# Altium footprint library eLIB.PcbLib: 206 footprints (part 5 of 13)
Each footprint in its own frame and in the unit in brackets; x right, y up, seen from the top. Pads: shape width x height; smd on the part's side, far side on the other; paste and mask are expansions set on the pad; w line width, h text height; cw(c..) or ccw(c..) is an arc to the next point about the centre after c.
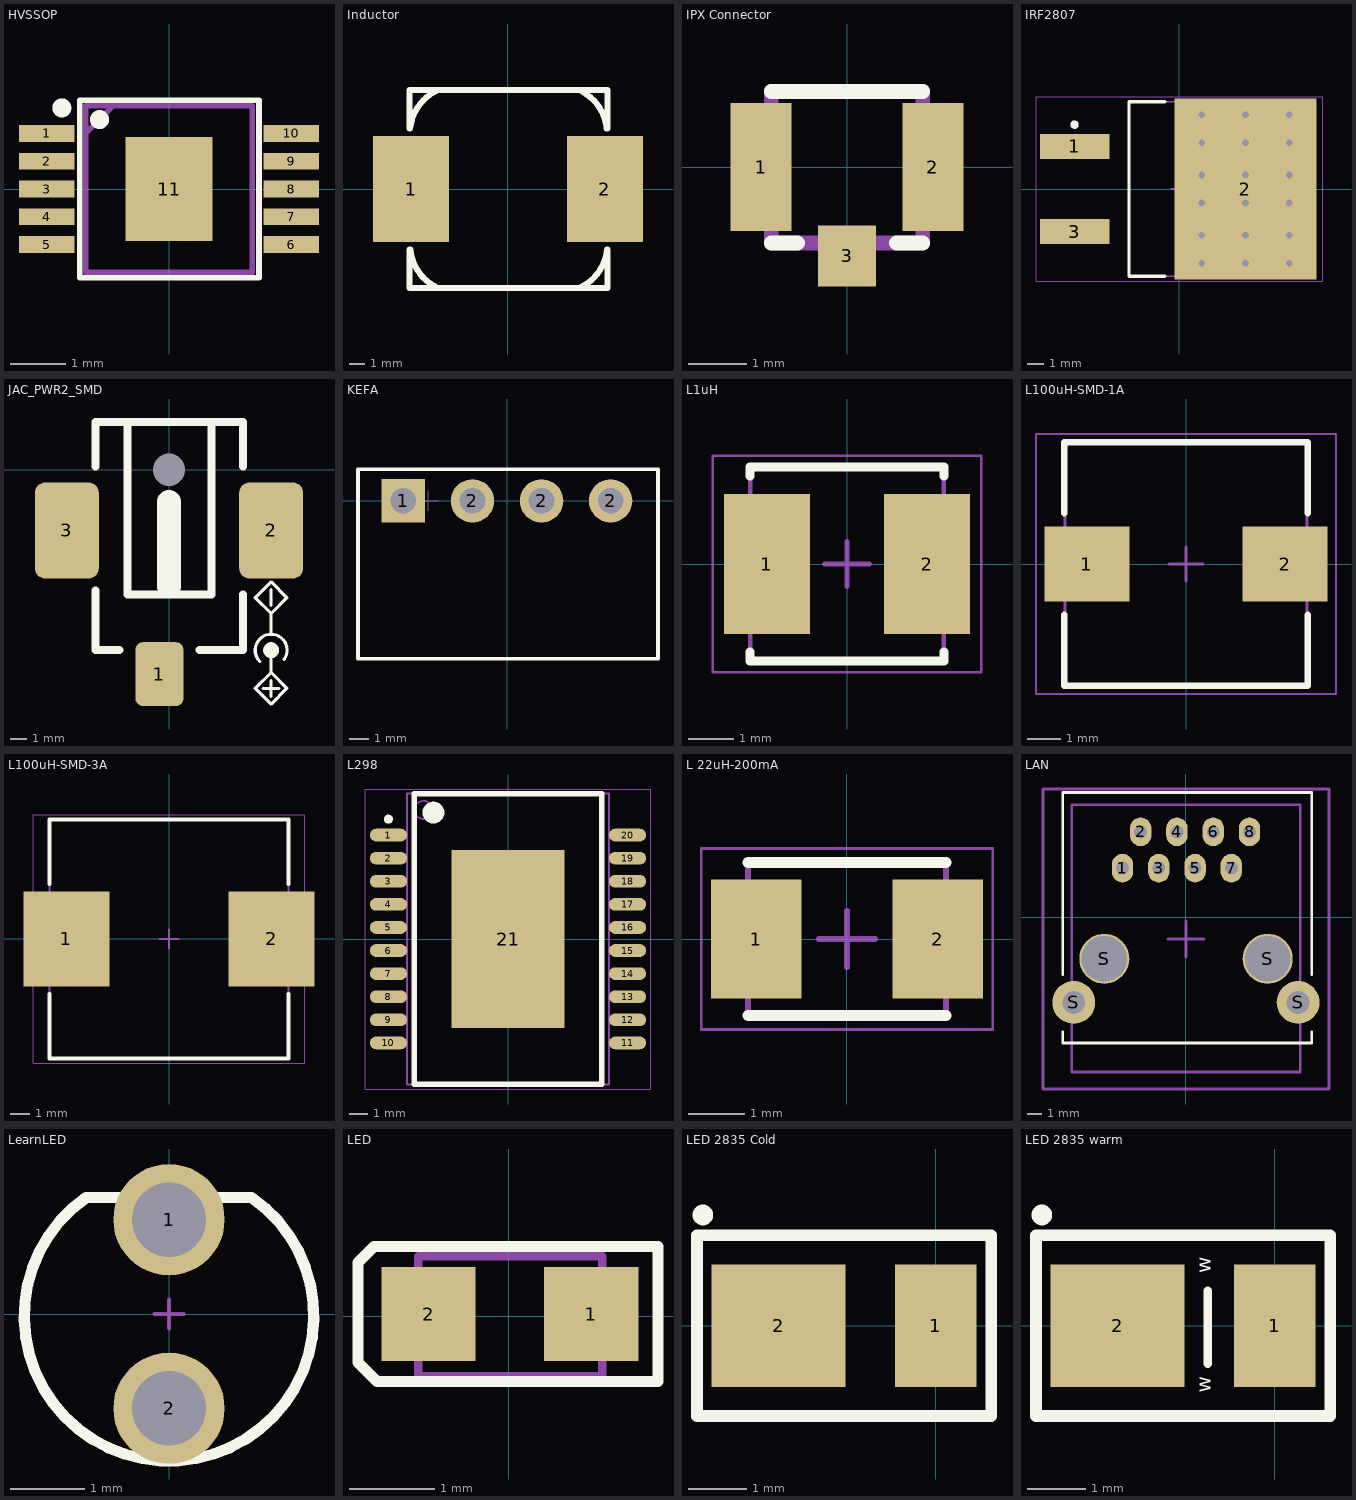
[diagram p4: the footprints below, top view; thin cyan lines are the x and y axes]

## HVSSOP [mm]
pads (11):
  rect 1x0.3 smd: 1(-2.2,1) 2(-2.2,0.5) 3(-2.2,0) 4(-2.2,-0.5) 5(-2.2,-1) 6(2.2,-1) 7(2.2,-0.5) 8(2.2,0) 9(2.2,0.5) 10(2.2,1)
  rect 1.57x1.88 smd: 11(0,0)
Top Overlay:
  circle w0.2: c-1.25,1.25 r0.071
  circle w0.2: c-1.93,1.46 r0.071
  lines w0.1: -1.61,-1.6 -1.61,1.6 1.62,1.6 1.62,-1.6 -1.61,-1.6
Mechanical 13:
  lines w0.1: -1.5,1 -1,1.5 ; -1.5,-1.5 -1.5,1.5 1.5,1.5 1.5,-1.5 -1.5,-1.5
3D body "XTR111AIDGQR.stp": height 1.1, standoff 0, extent -2.45,-1.5 2.45,1.5

## Inductor [mm]
pads (2):
  rect 5x7 smd: 1(-6.4,0) 2(6.4,0)
Top Overlay:
  lines w0.4: -6.504,-3.999 -6.504,-6.539 6.577,-6.539 6.577,-3.999 ; -6.504,4.002 -6.504,6.542 6.577,6.542 6.577,4.002 ; -6.457,3.996 cw(c-3.37,3.69) -4.681,6.501 ; -6.446,-3.993 ccw(c-3.354,-3.689) -4.601,-6.534 ; 4.668,6.54 cw(c3.427,3.692) 6.519,3.996 ; 4.775,-6.491 ccw(c3.446,-3.689) 6.533,-3.995
3D body "SRP1038A-470M.stp": height 4, standoff 0, extent -5.4,-5.07 5.6,4.93

## IPX Connector [mm] "IPX Connector GSP/GPS antenna"
pads (3):
  rect 1.05x2.2 smd: 1(-1.475,0) 2(1.475,0)
  rect 1x1.05 smd: 3(0,-1.525)
Top Overlay:
  lines w0.254: -1.3,-1.3 -0.85,-1.3 ; -1.3,1.3 1.3,1.3 ; 0.85,-1.3 1.3,-1.3
Mechanical 13:
  lines w0.254: -1.3,-1.3 -1.3,1.3 1.3,1.3 1.3,-1.3 -1.3,-1.3
3D body "User Library-IPX ANTENNA.STEP": height 1.27, standoff -0.01, extent -1.5,-1.55 1.5,1.3

## IRF2807 [mm] "D2-PAK, 3-Pads, Body 7.93x8.57mm (max), IPC Medium Density"
height 4.83
pads (3):
  rect 4.15x1.5 smd: 1(-6.25,2.54) 3(-6.25,-2.54)
  rect 8.5x10.8 smd: 2(3.95,0)
via 1.336,-4.424 diameter 0.8 hole 0.4
via 1.336,-2.754 diameter 0.8 hole 0.4
via 1.336,0.835 diameter 0.8 hole 0.4
via 1.336,-0.835 diameter 0.8 hole 0.4
via 1.336,4.423 diameter 0.8 hole 0.4
via 1.336,2.753 diameter 0.8 hole 0.4
via 6.555,-4.424 diameter 0.8 hole 0.4
via 3.945,-2.754 diameter 0.8 hole 0.4
via 3.945,-0.835 diameter 0.8 hole 0.4
via 3.945,0.835 diameter 0.8 hole 0.4
via 6.555,4.423 diameter 0.8 hole 0.4
via 3.945,2.753 diameter 0.8 hole 0.4
via 3.945,-4.424 diameter 0.8 hole 0.4
via 6.555,-2.754 diameter 0.8 hole 0.4
via 6.555,-0.835 diameter 0.8 hole 0.4
via 6.555,0.835 diameter 0.8 hole 0.4
via 6.555,2.753 diameter 0.8 hole 0.4
via 3.945,4.423 diameter 0.8 hole 0.4
Bottom Layer:
  region: 5.838,5.258 5.168,3.588 7.27,3.588 7.941,5.258
  region: 7.271,3.588 7.941,1.918 5.84,1.918 5.168,3.588
  region: 4.66,0 5.33,-1.67 3.229,-1.67 2.557,0
  region: 3.229,1.67 2.559,0 4.66,0 5.331,1.67
  region: 2.049,0 2.719,-1.67 0.618,-1.67 -0.053,0
  region: 0.619,1.67 -0.051,0 2.05,0 2.722,1.67
  region: 5.838,1.67 5.168,0 7.27,0 7.941,1.67
  region: 7.271,0 7.941,-1.67 5.84,-1.67 5.168,0
  region: 7.271,-3.589 7.941,-5.259 5.84,-5.259 5.168,-3.589
  region: 5.838,-1.919 5.168,-3.589 7.27,-3.589 7.941,-1.919
  region: 0.619,-1.919 -0.051,-3.589 2.05,-3.589 2.722,-1.919
  region: 2.049,-3.589 2.719,-5.259 0.618,-5.259 -0.053,-3.589
  region: 3.229,-1.919 2.559,-3.589 4.66,-3.589 5.331,-1.919
  region: 4.66,-3.589 5.33,-5.259 3.229,-5.259 2.557,-3.589
  region: 4.66,3.588 5.33,1.918 3.229,1.918 2.557,3.588
  region: 3.229,5.258 2.559,3.588 4.66,3.588 5.331,5.258
  region: 2.049,3.588 2.719,1.918 0.618,1.918 -0.053,3.588
  region: 0.619,5.258 -0.051,3.588 2.05,3.588 2.722,5.258
Top Overlay:
  circle w0.25: c-6.25,3.84 r0.125
  lines w0.2: -0.85,-5.2 -3,-5.2 -3,5.2 -0.85,5.2
Mechanical 13:
  lines w0.1: -3,-5.2 6.65,-5.2 6.65,5.2 -3,5.2 -3,-5.2
Mechanical 15:
  lines w0.05: -8.55,-5.5 8.55,-5.5 8.55,5.5 -8.55,5.5 -8.55,-5.5
  lines w0.1: -0.5,0 0.5,0 ; 0,-0.5 0,0.5
3D body: height 4.83, standoff 0, extent -3,-5.2 6.65,5.2

## JAC_PWR2_SMD [mm] "DC POWER JACK, CUI PJ-036A-SMT"
pads (4):
  rrect30% 3x4 smd: 1(-0.6,-12.8)
  rrect30% 4x6 smd: 2(6.4,-3.8) 3(-6.4,-3.8)
  rrect30% 0x0 hole 2.032 unplated: 4(0,0)
Top Overlay:
  circle w0.4: c6.4,-11.3 r0.3
  lines w0.2: 5.693,-12.007 cw(c6.4,-11.3) 7.219,-11.874 ; 5.9,-13.7 6.9,-13.7 ; 6.4,-14.2 6.4,-13.2 ; 6.4,-11.3 6.4,-12.7 ; 6.4,-10.3 6.4,-9 ; 6.4,-8.5 6.4,-7.5 ; 6.4,-12.7 5.41,-13.69 6.4,-14.68 7.39,-13.69 6.4,-12.7 ; 6.4,-9 7.39,-8.01 6.4,-7.02 5.41,-8.01 6.4,-9
  lines w0.5: -4.6,-7.55 -4.6,-11.3 -3.1,-11.3 ; -4.6,0.2 -4.6,3 4.65,3 4.65,0.2 ; -2.6,3 -2.6,-7.8 2.65,-7.8 2.65,2.9 ; 1.9,-11.3 4.65,-11.3 4.65,-7.8
  lines w1.5: 0,-7.3 0,-2
3D body "CUI-PJ-036A-SMT.step": height 11.09, standoff -1.51, extent -7.5,-14.1 7.7,3

## KEFA [mm] "KEFA 2.54"
pads (4):
  rect 2.2x2.2 hole 1.3: 1(-5.25,0)
  round 2.2 hole 1.3: 2(-1.75,0) 2(1.75,0) 2(5.25,0)
Top Overlay:
  lines w0.2: -7.55,-8 7.65,-8 7.65,1.6 -7.55,1.6 -7.55,-8
Mechanical 15:
  lines w0.05: -4.48,0 -3.48,0 ; -3.98,-0.5 -3.98,0.5
3D body "KEFA.STEP": height 7.2, standoff -3.7, extent -7.45,-7.85 7.55,1.45

## L1uH [mm] "Coilcraft XFL4020-102 4 x 4 x 2.1 5.1A/10.8 mO"
height 2.29
pads (2):
  rect 1.9x3.1 smd: 1(-1.775,0) 2(1.775,0)
Top Overlay:
  lines w0.2: -2.15,-1.95 -2.15,-2.15 2.15,-2.15 2.15,-1.95 ; -2.15,1.95 -2.15,2.15 2.15,2.15 2.15,1.95
Mechanical 13:
  lines w0.1: -2.15,-2.15 -2.15,2.15 2.15,2.15 2.15,-2.15 -2.15,-2.15
Mechanical 15:
  lines w0.05: -2.975,-2.4 -2.975,2.4 2.975,2.4 2.975,-2.4 -2.975,-2.4
  lines w0.1: -0.5,0 0.5,0 ; 0,-0.5 0,0.5
3D body "L1uH.step": height 2.39, standoff 0, extent -2.175,-2.075 2.175,2.075

## L100uH-SMD-1A [mm] "Precision Wire Wound Inductor, 2-Leads, Body 7.25x7.25mm, IPC Medium Density"
height 3.92
pads (2):
  rect 2.55x2.25 smd: 1(-2.975,0) 2(2.975,0)
Top Overlay:
  lines w0.2: -3.65,-1.525 -3.65,-3.65 3.65,-3.65 3.65,-1.525 ; -3.65,1.525 -3.65,3.65 3.65,3.65 3.65,1.525
Mechanical 13:
  lines w0.1: -3.63,-3.63 3.63,-3.63 3.63,3.63 -3.63,3.63 -3.63,-3.63
Mechanical 15:
  lines w0.05: -4.5,-3.9 4.5,-3.9 4.5,3.9 -4.5,3.9 -4.5,-3.9
  lines w0.1: -0.5,0 0.5,0 ; 0,-0.5 0,0.5
3D body: height 3, standoff 0, extent -3.63,-3.63 3.63,3.63

## L100uH-SMD-3A [mm] "Precision Wire Wound Inductor, 2-Leads, Body 12.45x12.45mm, IPC Medium Density"
height 7.7
pads (2):
  rect 4.5x4.95 smd: 1(-5.375,0) 2(5.375,0)
Top Overlay:
  lines w0.2: -6.25,-2.875 -6.25,-6.25 6.25,-6.25 6.25,-2.875 ; -6.25,2.875 -6.25,6.25 6.25,6.25 6.25,2.875
Mechanical 13:
  lines w0.1: -6.25,-6.25 6.25,-6.25 6.25,6.25 -6.25,6.25 -6.25,-6.25
Mechanical 15:
  lines w0.05: -7.1,-6.5 7.1,-6.5 7.1,6.5 -7.1,6.5 -7.1,-6.5
  lines w0.1: -0.5,0 0.5,0 ; 0,-0.5 0,0.5
3D body "Inductor 3A.STEP": height 7.07, standoff 0.08, extent -6,-6 6,6

## L298 [mm] "SOP, 20-Leads, Body 15.90x11.00mm, Pitch 1.27mm, Thermal Pad 9.80x6.20mm, IPC Medium Density"
height 3.6
pads (21):
  oval 2.05x0.7 smd: 1(-6.575,5.715) 2(-6.575,4.445) 3(-6.575,3.175) 4(-6.575,1.905) 5(-6.575,0.635) 6(-6.575,-0.635) 7(-6.575,-1.905) 8(-6.575,-3.175) 9(-6.575,-4.445) 10(-6.575,-5.715) 11(6.575,-5.715) 12(6.575,-4.445) 13(6.575,-3.175) 14(6.575,-1.905) 15(6.575,-0.635) 16(6.575,0.635) 17(6.575,1.905) 18(6.575,3.175) 19(6.575,4.445) 20(6.575,5.715)
  rect 6.2x9.8 smd: 21(0,0)
Top Overlay:
  circle w0.6: c-4.1,6.95 r0.3
  circle w0.25: c-6.575,6.59 r0.125
  lines w0.3: -5.15,-8 5.15,-8 5.15,8 -5.15,8 -5.15,-8
Mechanical 13:
  circle w0.1: c-4.65,7.1 r0.5
  lines w0.1: -5.55,-8 5.55,-8 5.55,8 -5.55,8 -5.55,-8
Mechanical 15:
  lines w0.05: -7.85,-8.25 7.85,-8.25 7.85,8.25 -7.85,8.25 -7.85,-8.25
  lines w0.1: -0.5,0 0.5,0 ; 0,-0.5 0,0.5
3D body: height 3.6, standoff 0.1, extent -5.55,-8 5.55,8

## L 22uH-200mA [mm] "Precision Wire Wound Inductor, 2-Leads, Body 3.40x2.60mm, IPC Medium Density"
height 2.25
pads (2):
  rect 1.6x2.1 smd: 1(-1.6,0) 2(1.6,0)
Top Overlay:
  lines w0.2: -1.75,-1.35 1.75,-1.35 ; -1.75,1.35 1.75,1.35
Mechanical 13:
  lines w0.1: -1.75,-1.35 1.75,-1.35 1.75,1.35 -1.75,1.35 -1.75,-1.35
Mechanical 15:
  lines w0.05: -2.575,-1.6 2.575,-1.6 2.575,1.6 -2.575,1.6 -2.575,-1.6
  lines w0.1: -0.5,0 0.5,0 ; 0,-0.5 0,0.5
3D body "INDUCTOR 22uH.step": height 2.35, standoff 0, extent -1.8,-1.3 1.8,1.3

## LAN [mm]
height 13.3
pads (12):
  oval 1.5x2 hole 0.9: 1(-4.44,3.43) 2(-3.17,5.97) 3(-1.9,3.43) 4(-0.63,5.97) 5(0.64,3.43) 6(1.91,5.97) 7(3.18,3.43) 8(4.45,5.97)
  round 3 hole 1.6: S(-7.85,-5.97) S(7.85,-5.97)
  round 3.5 hole 3.2: S(-5.71,-2.92) S(5.72,-2.92)
Top Overlay:
  lines w0.2: -8.62,-8.03 -8.62,-8.8 8.81,-8.8 8.81,-8.02 ; -8.62,-4.03 -8.62,8.73 8.81,8.73 8.81,-3.225 8.81,-4.03
Mechanical 1:
  lines w0.2: -7.995,-10.83 8.005,-10.83 8.005,7.87 -7.995,7.87 -7.995,-10.83
Mechanical 15:
  lines w0.2: -9.995,-12.03 -9.995,8.97 10.005,8.97 10.005,-12.03 -9.995,-12.03 ; -1.245,-1.53 1.255,-1.53 -1.245,-1.53 ; 0.005,-2.78 0.005,-0.28 0.005,-2.78
3D body "ASSMANN A-2004-2-4-LPS-N-R.STEP": height 13.3, standoff -3.5, extent -7.995,-10.83 8.005,7.87

## LearnLED [mm]
pads (2):
  round 1.5 hole 1: 1(0,1.27) 2(0,-1.27)
Top Overlay:
  lines w0.15: -1.113,1.57 1.113,1.57 ; -1.114,1.571 ccw(c0,-0.03) 1.113,1.571
Mechanical 15:
  lines w0.05: -0.2,0 0.2,0 ; 0,-0.2 0,0.2
3D body "151034xxx.stp": height 5.4, standoff -26.3, extent -1.949,-1.966 1.949,1.604

## LED [mm]
pads (2):
  rect 1.1x1.1 smd: 1(0.963,0.028) 2(-0.938,0.028)
Top Overlay:
  lines w0.127: -1.76,-0.538 -1.538,-0.76 1.74,-0.76 1.74,0.815 -1.573,0.815 -1.76,0.628 -1.76,-0.538
Mechanical 13:
  lines w0.1: -1.059,-0.7 -1.059,0.7 1.091,0.7 1.091,-0.7 -1.059,-0.7
3D body "User Library-LED_0603_G.STEP": height 0.6, standoff 0, extent -0.822,-0.362 0.778,0.438

## LED 2835 Cold [mm] "LED 2835 3.5mm * 2.75mm 0.2W 3V"
height 0.6
pads (2):
  rect 1.4x2.1 smd: 1(0,0)
  rect 2.3x2.1 smd: 2(-2.7,0)
Top Overlay:
  circle w0.254: c-4,1.9 r0.05
  lines w0.2: -4.1,-1.55 0.95,-1.55 0.95,1.55 -4.1,1.55 -4.1,-1.55
3D body "User Library-PLCC2LED.STEP": height 0.7, standoff 0, extent -3.4,-1.4 0.1,1.4

## LED 2835 warm [mm] "LED 2835 3.5mm * 2.75mm 0.2W 3V"
height 0.6
pads (2):
  rect 1.4x2.1 smd: 1(0,0)
  rect 2.3x2.1 smd: 2(-2.7,0)
Top Overlay:
  circle w0.254: c-4,1.9 r0.05
  lines w0.15: -1.15,-0.65 -1.15,0.6
  lines w0.2: -4.1,-1.55 -4.1,1.55 0.95,1.55 0.95,-1.55 -4.1,-1.55
  text "w" at -1.1,-1.15 h0.25
  text "w" at -1.1,0.9 h0.25
3D body "User Library-PLCC2LED.STEP": height 0.7, standoff 0, extent -3.4,-1.4 0.1,1.4